# Altium footprint library SecurityBoard.PcbLib: 36 footprints (part 2 of 3)
Each footprint in its own frame and in the unit in brackets; x right, y up, seen from the top. Pads: shape width x height; smd on the part's side, far side on the other; paste and mask are expansions set on the pad; w line width, h text height; cw(c..) or ccw(c..) is an arc to the next point about the centre after c.
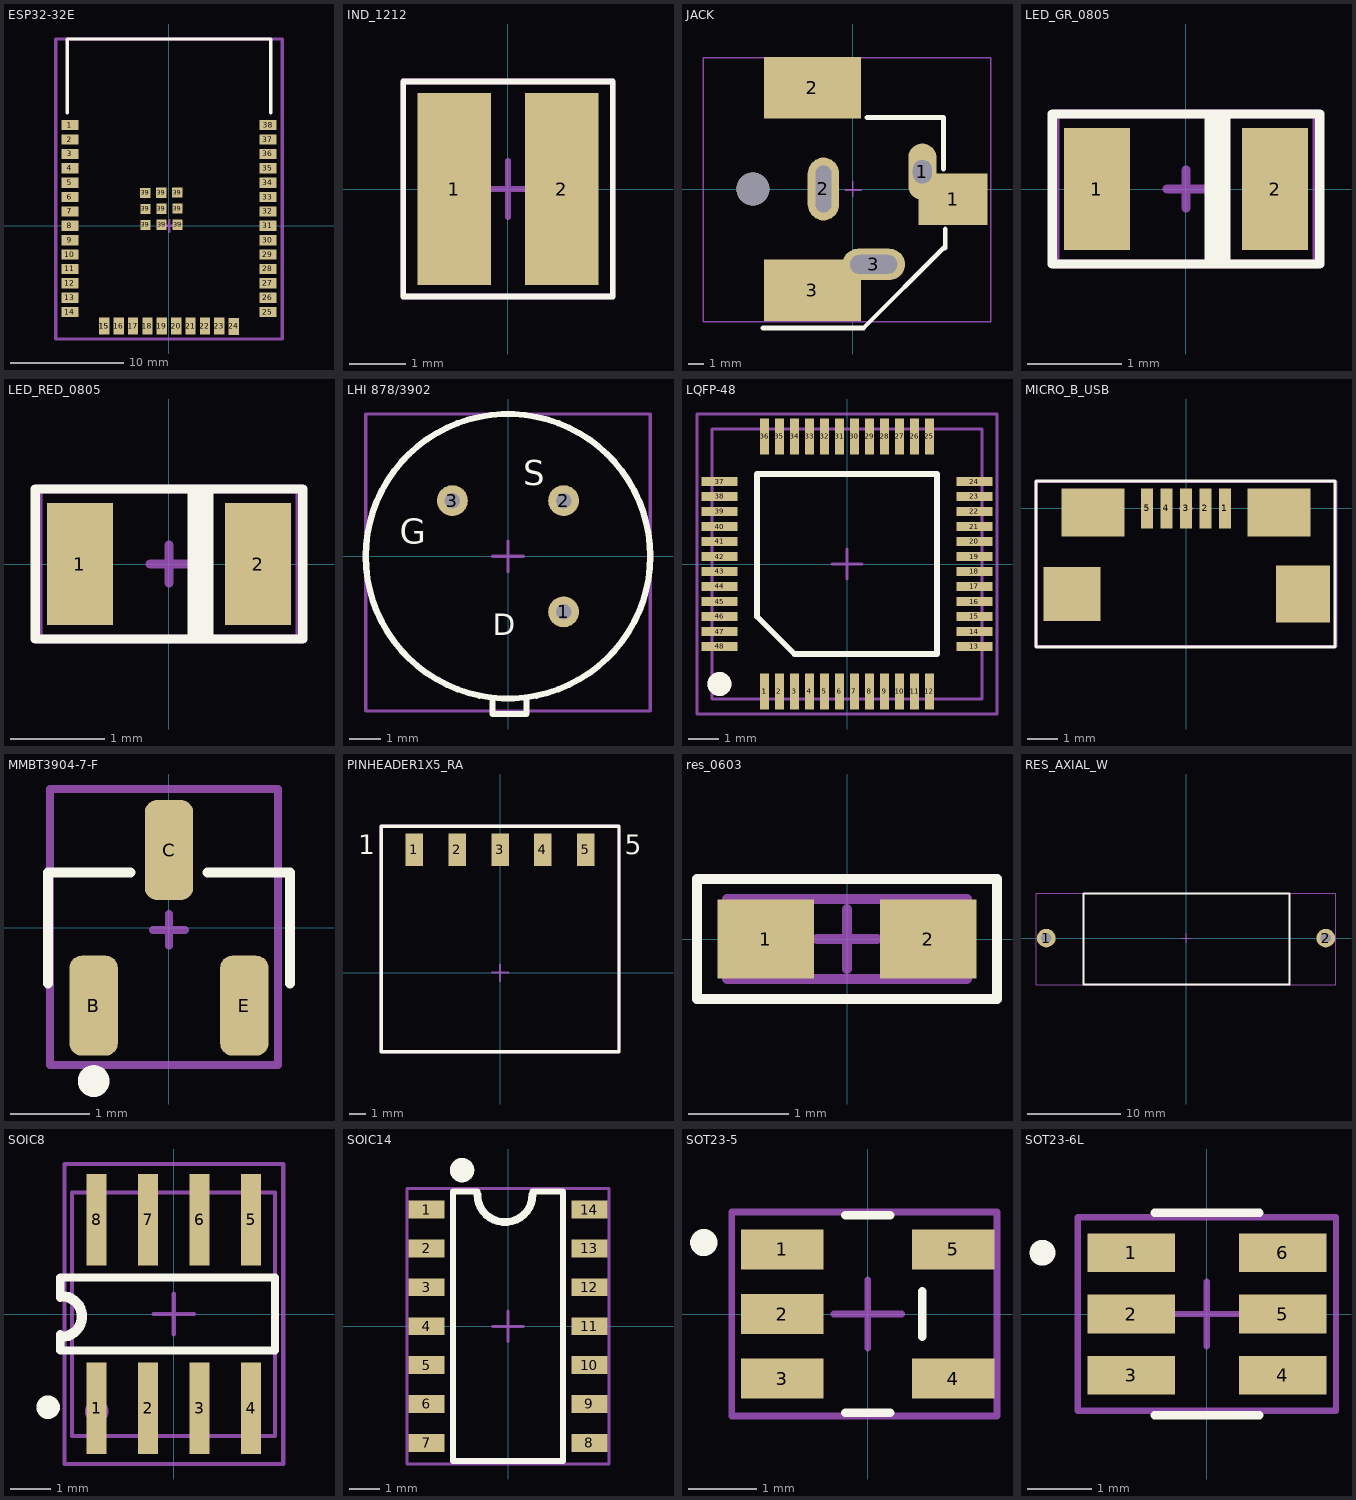
[diagram p1: the footprints below, top view; thin cyan lines are the x and y axes]

## ESP32-32E [mm]
pads (48):
  rect 1.5x0.9 smd: 1(-8.745,8.89) 2(-8.745,7.62) 3(-8.745,6.35) 4(-8.745,5.08) 5(-8.745,3.81) 6(-8.745,2.54) 7(-8.745,1.27) 8(-8.745,0) 9(-8.745,-1.27) 10(-8.745,-2.54) 11(-8.745,-3.81) 12(-8.745,-5.08) 13(-8.745,-6.35) 14(-8.745,-7.62) 25(8.745,-7.62) 26(8.745,-6.35) 27(8.745,-5.08) 28(8.745,-3.81) 29(8.745,-2.54) 30(8.745,-1.27) 31(8.745,0) 32(8.745,1.27) 33(8.745,2.54) 34(8.745,3.81) 35(8.745,5.08) 36(8.745,6.35) 37(8.745,7.62) 38(8.745,8.89)
  rect 0.9x1.5 smd: 15(-5.715,-8.87) 15(-5.715,-8.87) 16(-4.445,-8.87) 17(-3.175,-8.87) 18(-1.905,-8.87) 19(-0.635,-8.87) 20(0.635,-8.87) 21(1.905,-8.87) 22(3.175,-8.87) 23(4.445,-8.87) 24(5.715,-8.89)
  rect 0.9x0.9 smd: 39(-2.1,2.91) 39(-2.089,1.494) 39(-2.078,0.078) 39(-0.684,2.921) 39(-0.673,1.505) 39(-0.662,0.089) 39(0.732,2.932) 39(0.743,1.516) 39(0.754,0.1)
Top Overlay:
  lines w0.3: -9,10 -9,16.5 9,16.5 9,10
Top Component Center:
  lines w0.2: -0.5,0 0.5,0 ; 0.02,-0.52 0.02,0.48
  lines w0.3: -10,-10 -10,16.5 10,16.5 10,-10 -10,-10
Top Designator:
  lines w0.3: -10,-10 -10,16.5 10,16.5 10,-10 -10,-10
  text "'.Designator'" at -6.1,1 h1.2
3D body "User Library-esp-wroom-32.step": height 3.05, standoff 0.01, extent -9.05,-9.16 9.02,16.38

## IND_1212 [mm]
pads (2):
  rect 1.3x3.4 smd: 1(-0.95,0) 2(0.95,0)
Top Overlay:
  lines w0.1: -1.85,-1.9 -1.85,1.9 1.85,1.9 1.85,-1.9 -1.85,-1.9
Top Component Center:
  lines w0.1: -1.85,-1.9 -1.85,1.9 1.85,1.9 1.85,-1.9 -1.85,-1.9
  text "'.Designator'" at -1.5,-1 h0.8
Top Designator:
  lines w0.1: -0.5,0 0.5,0 ; 0,-0.5 0,0.5 ; -1.85,-1.9 -1.85,1.9 1.85,1.9 1.85,-1.9 -1.85,-1.9
3D body "78438335010_Download_STP_WE-MAIA-3015_rev1.stp": height 1.21, standoff 0.01, extent -1.5,-1.5 1.5,1.5

## JACK [mm]
pads (7):
  oval 1.8x3.6 hole 1.2 slot 1.5 at 90 deg: 1(4.425,1.1)
  rect 4.4x3.3 smd: 1(6.375,-0.65)
  rect 6.2x3.9 smd: 2(-2.575,6.45) 3(-2.575,-6.45)
  oval 2x4 hole 1 slot 3 at 90 deg: 2(-1.875,0)
  oval 4x2 hole 1.2 slot 3 at 0 deg: 3(1.325,-4.8)
  round 2.1 hole 2.1 unplated: ""(-6.375,0)
Top Overlay:
  lines w0.3: -5.725,-8.85 0.675,-8.85 5.825,-3.7 ; 0.875,4.55 5.575,4.55 5.775,4.55 5.775,1.25 ; 5.875,-3.75 5.875,-2.55
Top Component Center:
  lines w0.1: -0.485,-0.061 0.515,-0.061 ; 0,-0.5 0,0.5 ; -9.525,-8.45 -9.525,8.35 8.775,8.35 8.775,-8.45 -9.525,-8.45
Top Designator:
  lines w0.1: -9.525,-8.45 -9.525,8.35 8.775,8.35 8.775,-8.45 -9.525,-8.45
  text "'.Designator'" at -7.5,2 h1
3D body "CUI_DEVICES_PJ-037AH-SMT-TR.step": height 11.08, standoff -3.32, extent -9.425,-7.65 7.675,7.55

## LED_GR_0805 [mm]
pads (2):
  rect 0.7x1.3 smd mask+0.05: 1(-0.95,0) 2(0.95,0)
Top Overlay:
  rectangle: 0.2,-0.85 0.475,0.85
  lines w0.1: -1.425,-0.8 1.425,-0.8 1.425,0.8 -1.425,0.8 -1.425,-0.8
Top Component Center:
  lines w0.1: -0.2,0 0.2,0 ; 0,-0.2 0,0.2 ; -1.4,-0.8 1.4,-0.8 1.4,0.8 -1.4,0.8 -1.4,-0.8
Top Designator:
  lines w0.1: -1.4,-0.8 1.4,-0.8 1.4,0.8 -1.4,0.8 -1.4,-0.8
  text "'.Designator'" at -1.3,-0.5 h0.5
3D body "LEDGREEN.STEP": height 0.76, standoff 0.01, extent -1,-0.625 1,0.625

## LED_RED_0805 [mm]
pads (2):
  rect 0.7x1.3 smd mask+0.05: 1(-0.95,0) 2(0.95,0)
Top Overlay:
  rectangle: 0.2,-0.85 0.475,0.85
  lines w0.1: -1.425,-0.8 -1.425,0.8 1.425,0.8 1.425,-0.8 -1.425,-0.8
Top Component Center:
  lines w0.1: -0.2,0 0.2,0 ; 0,-0.2 0,0.2 ; -1.4,-0.8 -1.4,0.8 1.4,0.8 1.4,-0.8 -1.4,-0.8
Top Designator:
  lines w0.1: -1.4,-0.8 -1.4,0.8 1.4,0.8 1.4,-0.8 -1.4,-0.8
  text "'.Designator'" at -1.3,-0.5 h0.5
3D body "red led 0805.step": height 1.1, standoff 0, extent -1.01,-0.625 1.01,0.625

## LHI 878/3902 [mm]
pads (3):
  round 1 hole 0.5: 1(1.798,-1.798) 2(1.8,1.8) 3(-1.8,1.8)
Top Overlay:
  circle w0.2: c0,0 r4.6
  lines w0.2: -0.5,-4.6 -0.5,-5.1 0.6,-5.1 0.6,-4.6
  text "D" at -0.5,-2.8 h1.2
  text "S" at 0.5,2.3 h0.8
  text "G" at -3.5,0.4 h0.8
Top Component Center:
  lines w0.1: -0.5,0 0.5,0 ; 0,-0.5 0,0.5 ; -4.6,-5 -4.6,4.6 4.6,4.6 4.6,-5 -4.6,-5
Top Designator:
  lines w0.1: -4.6,-5 -4.6,4.6 4.6,4.6 4.6,-5 -4.6,-5
  text "'.Designator'" at -4.4,-1.7 h1.2
3D body "LHI 8783902.step": height 4.3, standoff -2.7, extent -4.6,-5.029 4.6,4.6

## LQFP-48 [mm]
pads (49):
  rect 0.3x1.2 smd mask+0.05: 1(-2.75,-4.25) 1(-2.75,-4.25) 2(-2.25,-4.25) 3(-1.75,-4.25) 4(-1.25,-4.25) 5(-0.75,-4.25) 6(-0.25,-4.25) 7(0.25,-4.25) 8(0.75,-4.25) 9(1.25,-4.25) 10(1.75,-4.25) 11(2.25,-4.25) 12(2.75,-4.25) 25(2.75,4.25) 26(2.25,4.25) 27(1.75,4.25) 28(1.25,4.25) 29(0.75,4.25) 30(0.25,4.25) 31(-0.25,4.25) 32(-0.75,4.25) 33(-1.25,4.25) 34(-1.75,4.25) 35(-2.25,4.25) 36(-2.75,4.25)
  rect 1.2x0.3 smd mask+0.05: 13(4.25,-2.75) 14(4.25,-2.25) 15(4.25,-1.75) 16(4.25,-1.25) 17(4.25,-0.75) 18(4.25,-0.25) 19(4.25,0.25) 20(4.25,0.75) 21(4.25,1.25) 22(4.25,1.75) 23(4.25,2.25) 24(4.25,2.75) 37(-4.25,2.75) 38(-4.25,2.25) 39(-4.25,1.75) 40(-4.25,1.25) 41(-4.25,0.75) 42(-4.25,0.25) 43(-4.25,-0.25) 44(-4.25,-0.75) 45(-4.25,-1.25) 46(-4.25,-1.75) 47(-4.25,-2.25) 48(-4.25,-2.75)
Top Overlay:
  circle w0.4: c-4.25,-4 r0.2
  lines w0.2: -3,-1.75 -3,3 3,3 3,-3 -1.75,-3 -3,-1.75
Top 3D Body:
  circle w0.4: c-4.25,-4 r0.2
  lines w0.1: -4.5,-4.5 -4.5,4.5 4.5,4.5 4.5,-4.5 -4.5,-4.5
Top Component Center:
  lines w0.1: -0.5,0 0.5,0 ; 0,-0.5 0,0.5 ; -5,-5 5,-5 5,5 -5,5 -5,-5
Top Designator:
  lines w0.1: -5,-5 5,-5 5,5 -5,5 -5,-5
  text ".Designator" at -3.618,-0.508 h1.52
3D body "User Library-P-LQFP48-7x7-0_50.step": height 1.45, standoff 0, extent -4.5,-4.5 4.5,4.5

## MICRO_B_USB [mm]
pads (9):
  rect 0.4x1.35 smd paste+0 mask+0.05: 1(1.3,0) 2(0.65,0) 3(0,0) 4(-0.65,0) 5(-1.3,0)
  rect 1.9x1.8 smd paste+0 mask+0.05: ""(-3.8,-2.85)
  rect 2.1x1.6 smd paste+0 mask+0.05: ""(-3.1,-0.125) ""(3.1,-0.125)
  rect 1.8x1.9 smd paste+0 mask+0.05: ""(3.9,-2.85)
Top Overlay:
  lines w0.1: -5,-4.625 4.975,-4.625 4.975,0.925 -5,0.925 -5,-4.625
Top Component Center:
  lines w0.1: -0.198,-0.006 0.202,-0.006 ; 0,-0.2 0,0.2 ; -5,-4.6 -5,0.9 5,0.9 5,-4.6 -5,-4.6
Top Designator:
  lines w0.1: -5,-4.6 -5,0.9 5,0.9 5,-4.6 -5,-4.6
  text "'.Designator'" at -4,-3.4 h1
3D body "microb.stp": height 2.78, standoff -0.23, extent -3.956,-5.361 3.956,0.3

## MMBT3904-7-F [mm]
pads (3):
  rrect50% 0.61x1.26 smd: B(-0.95,-0.98) C(0,0.98) E(0.95,-0.98)
Top Overlay:
  circle w0.2: c-0.95,-1.93 r0.1
  lines w0.127: -1.525,-0.7 -1.525,0.7 -0.489,0.7 ; 0.489,0.7 1.525,0.7 1.525,-0.7
Top Component Center:
  lines w0.1: -0.2,-0.025 0.2,-0.025 ; 0,-0.225 0,0.175 ; -1.5,-1.725 1.375,-1.725 1.375,1.75 -1.5,1.75 -1.5,-1.725
Top Designator:
  lines w0.1: -1.5,-1.725 1.375,-1.725 1.375,1.75 -1.5,1.75 -1.5,-1.725
  text "'.Designator'" at -1.425,-0.55 h0.6
3D body "MMBT3904-7-F.STEP": height 1.01, standoff -0.09, extent -1.025,-1.3 0.975,0.8

## PINHEADER1X5_RA [mil]
pads (5):
  rect 40.95x75.2 smd: 1(-200,286.5) 2(-100,286.5) 3(0,286.5) 4(100,286.5) 5(200,286.5)
Top Overlay:
  lines w7.87: -277.72,-185.24 -277.72,341.85 277.72,341.85 277.72,-185.24 -277.72,-185.24
  text "1" at -331.65,261.5 h77.5
  text "5" at 291.14,261.5 h77.5
Top Component Center:
  lines w3.94: -19.68,0 19.68,0 ; 0,-19.68 0,19.68
  lines w7.87: -277.72,-185.24 -277.72,341.85 277.72,341.85 277.72,-185.24 -277.72,-185.24
Top Designator:
  lines w7.87: -277.72,-185.24 -277.72,341.85 277.72,341.85 277.72,-185.24 -277.72,-185.24
  text "'.Designator'" at -216.54,59.06 h39.37
3D body "SMH-105-02-L-S.stp": height 95.5, standoff 0.5, extent -260,-157.48 260,312.52

## res_0603 [mil]
pads (2):
  rect 38x31 smd: 1(-32,0) 2(32,0)
Top Overlay:
  lines w3.94: -59.06,-23.62 -59.06,-11.81 -59.06,23.62 59.06,23.62 59.06,-23.62 -59.06,-23.62
Top 3D Body:
  lines w3.94: -47.24,-15.75 47.24,-15.75 47.24,15.75 -39.37,15.75 -47.24,15.75 -47.24,7.87 -47.24,-15.75
Top Component Center:
  lines w3.94: -11.81,0 0,0 11.81,0 ; 0,-11.81 0,11.81 ; -59.06,-23.62 -59.06,23.62 59.06,23.62 59.06,-23.62 -59.06,-23.62
Top Designator:
  lines w3.94: -59.06,-23.62 -59.06,23.62 59.06,23.62 59.06,-23.62 -59.06,-23.62
  text "'.Designator'" at -55.12,-15.75 h15.75
3D body "asd.step": height 31.69, standoff 0, extent -48.43,-15.75 48.43,15.75

## RES_AXIAL_W [mm]
pads (2):
  round 2 hole 1.1 mask+0.05: 1(-15,0) 2(15,0)
Top Overlay:
  lines w0.2: -11,-5 11.1,-5 11.1,4.8 -11,4.8 -11,-5
Top Component Center:
  lines w0.1: -0.5,0 0.5,0 ; 0,-0.5 0,0.5 ; -16.1,-5 -16.1,0 -16.1,4.8 16.1,4.8 16.1,-5 -16.1,-5
Top Designator:
  lines w0.1: -16.1,-5 -16.1,0 -16.1,4.8 16.1,4.8 16.1,-5 -16.1,-5
  text "'.Designator'" at -6,-1.5 h1.5
3D body: height 5.25, standoff -5.25, extent -11,-4.825 11,4.675
3D body: height 5, standoff -4, extent 14.588,-0.432 15.385,0.366
3D body: height 5.2, standoff 4.4, extent 6.425,-0.447 15.425,0.35
3D body: height 5, standoff -4, extent -15.385,-0.366 -14.588,0.432
3D body: height 5.2, standoff 4.4, extent -15.425,-0.35 -6.425,0.447

## SOIC8 [mm]
pads (8):
  rect 0.5x2.25 smd: 1(-1.905,-2.325) 2(-0.635,-2.325) 3(0.635,-2.325) 4(1.905,-2.325) 5(1.905,2.325) 6(0.635,2.325) 7(-0.635,2.325) 8(-1.905,2.325)
Top Overlay:
  circle w0.3: c-3.1,-2.3 r0.141
  lines w0.2: -2.8,-0.5 -2.8,-0.9 2.5,-0.9 2.5,0.9 -2.8,0.9 -2.8,0.4
  lines w0.254: -2.766,-0.56 ccw(c-2.766,-0.06) -2.766,0.44
Top 3D Body:
  circle w0.3: c-1.9,-2.4 r0.141
  lines w0.1: -2.505,-3.005 -2.505,2.995 2.495,2.995 2.495,-3.005 -2.505,-3.005
Top Component Center:
  lines w0.1: -0.5,0 0.5,0 ; 0,-0.5 0,0.5 ; -2.7,-3.7 2.7,-3.7 2.7,3.7 -2.7,3.7 -2.7,-3.7
Top Designator:
  lines w0.1: -2.7,-3.7 2.7,-3.7 2.7,3.7 -2.7,3.7 -2.7,-3.7
  text "'.Designator'" at 1.2,-3.7 h1.2
3D body "SOIC-8-1.step": height 1.75, standoff 0, extent -2.455,-3.005 2.445,2.995

## SOIC14 [mm]
pads (14):
  rect 1.18x0.58 smd paste+0 mask+0.05: 1(-2.66,3.81) 2(-2.66,2.54) 3(-2.66,1.27) 4(-2.66,0) 5(-2.66,-1.27) 6(-2.66,-2.54) 7(-2.66,-3.81) 8(2.66,-3.81) 9(2.66,-2.54) 10(2.66,-1.27) 11(2.66,0) 12(2.66,1.27) 13(2.66,2.54) 14(2.66,3.81)
Top Overlay:
  circle w0.4: c-1.5,5.1 r0.2
  lines w0.2: -1,4.4 -1.8,4.4 -1.8,-4.4 1.8,-4.4 1.8,4.4 0.8,4.4
  lines w0.254: -1,4.3 ccw(c-0.1,4.3) 0.8,4.3
Top Component Center:
  lines w0.1: -0.499,-0.015 0.501,-0.015 ; 0,-0.5 0,0.5 ; -3.3,-4.5 -3.3,4.5 3.3,4.5 3.3,-4.5 -3.3,-4.5
Top Designator:
  lines w0.1: -3.3,-4.5 -3.3,4.5 3.3,4.5 3.3,-4.5 -3.3,-4.5
  text "'.Designator'" at -2,-1 h1
3D body "so14-1.step": height 1.7, standoff 0, extent -3,-4.4 3,4.4

## SOT23-5 [mm]
pads (5):
  rect 1.21x0.59 smd mask+0.05: 1(-1.255,0.95) 2(-1.255,0) 3(-1.255,-0.95) 4(1.255,-0.95) 5(1.255,0.95)
Top Overlay:
  circle w0.2: c-2.41,1.05 r0.1
  lines w0.127: -0.33,-1.45 0.33,-1.45 ; -0.33,1.45 0.33,1.45 ; 0.8,-0.335 0.8,0.335
Top Component Center:
  lines w0.1: -0.5,0 0.5,0 ; 0,-0.5 0,0.5 ; -2,-1.5 1.9,-1.5 1.9,1.5 -2,1.5 -2,-1.5
Top Designator:
  lines w0.1: -2,-1.5 1.9,-1.5 1.9,1.5 -2,1.5 -2,-1.5
  text "'.Designator'" at -2,-1 h0.7
3D body "OPA314AIDBVR.STEP": height 1.31, standoff -0.14, extent -1.4,-1.45 1.4,1.45

## SOT23-6L [mm]
pads (6):
  rect 1.36x0.6 smd: 1(-1.175,0.95) 2(-1.175,0) 3(-1.175,-0.95) 4(1.175,-0.95) 5(1.175,0) 6(1.175,0.95)
Top Overlay:
  circle w0.2: c-2.55,0.95 r0.1
  lines w0.127: -0.813,-1.57 0.813,-1.57 ; -0.813,1.57 0.813,1.57
Top Component Center:
  lines w0.1: -0.5,0 0.5,0 ; 0,-0.5 0,0.5 ; -2,-1.5 2,-1.5 2,1.5 -2,1.5 -2,-1.5
Top Designator:
  lines w0.1: -2,-1.5 2,-1.5 2,1.5 -2,1.5 -2,-1.5
  text "'.Designator'" at -1.31,-0.978 h1
3D body "usblc6-2sc6.stp": height 1.18, standoff 0, extent -1.35,-1.45 1.45,1.446